# Altium footprint library esp32.PCBLIB: 2 footprints
Each footprint in its own frame and in the unit in brackets; x right, y up, seen from the top. Pads: shape width x height; smd on the part's side, far side on the other; paste and mask are expansions set on the pad; w line width, h text height; cw(c..) or ccw(c..) is an arc to the next point about the centre after c.
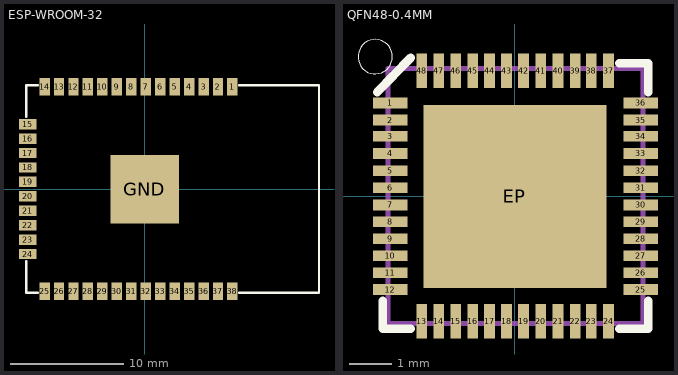
[diagram p0: the footprints below, top view; thin cyan lines are the x and y axes]

## ESP-WROOM-32 [mil]
pads (39):
  rect 36x60 smd: 1(304,355) 2(254,355) 3(204,355) 4(154,355) 5(104,355) 6(54,355) 7(4,355) 8(-46.85,355) 9(-96.85,355) 10(-146.85,355) 11(-196.85,355) 12(-246.85,355) 13(-296.85,355) 14(-346.85,355) 25(-346.85,-354.33) 26(-296.85,-354.33) 27(-246.85,-354.33) 28(-196.85,-354.33) 29(-146.85,-354.33) 30(-96.85,-354.33) 31(-46.85,-354.33) 32(4,-354.33) 33(54,-354.33) 34(104,-354.33) 35(154,-354.33) 36(204,-354.33) 37(254,-354.33) 38(304,-354.33)
  rect 60x36 smd: 15(-405.51,225) 16(-405.51,175) 17(-405.51,125) 18(-405.51,75) 19(-405.51,25) 20(-405.51,-25) 21(-405.51,-75) 22(-405.51,-125) 23(-405.51,-175) 24(-405.51,-225)
  rect 237x237 smd: GND(0,0)
Top Overlay:
  lines w8: -410.51,-250 -410.51,-359.33 -370.08,-359.33 ; -410.51,250 -410.51,360 -370.08,360 ; 328,-359.33 604,-359.33 604,360 328,360
Mechanical 8:
  region: 0,0 10,0 10,10 0,10
Mechanical 9:
  region: 0,0 10,0 10,10 0,10
Mechanical 10:
  region: 0,0 10,0 10,10 0,10
Mechanical 27:
  region: 0,0 10,0 10,10 0,10
Mechanical 28:
  region: 0,0 10,0 10,10 0,10
3D body: height 114.37, standoff -0.28, extent -405,-354.33 598.94,354.33

## QFN48-0.4MM [mil]
pads (49):
  rect 32x10 smd: 1(-116.14,87) 2(-116.14,71) 3(-116.14,56) 4(-116.14,40) 5(-116.14,24) 6(-116.14,8) 7(-116.14,-7.87) 8(-116.14,-23.62) 9(-116.14,-39.37) 10(-116.14,-55.12) 11(-116.14,-70.87) 12(-116.14,-86.61) 25(117,-86.61) 26(117,-70.87) 27(117,-55.12) 28(117,-39.37) 29(117,-23.62) 30(117,-7.87) 31(117,8) 32(117,24) 33(117,40) 34(117,56) 35(117,71) 36(117,87)
  rect 10x32 smd: 13(-86.61,-116.14) 14(-70.87,-116.14) 15(-55.12,-116.14) 16(-39.37,-116.14) 17(-23.62,-116.14) 18(-7.87,-116.14) 19(8,-116.14) 20(24,-116.14) 21(40,-116.14) 22(56,-116.14) 23(71,-116.14) 24(87,-116.14) 37(87,117) 38(71,117) 39(56,117) 40(40,117) 41(24,117) 42(8,117) 43(-7.87,117) 44(-23.62,117) 45(-39.37,117) 46(-55.12,117) 47(-70.87,117) 48(-86.61,117)
  rect 170x170 smd: EP(0,0)
Top Overlay:
  circle w0: c-130,130 r16
  lines w8: -128.11,97 -96.89,129 ; -123.11,-96.89 -123.11,-123.11 -96.89,-123.11 ; 97,-123.11 124,-123.11 124,-96.89 ; 97,124 124,124 124,97
Top Paste:
  rectangle: 13,13 73,73
  region: -12.32,13.07 -12.32,72.93 -72.32,72.93 -72.32,13.07
  region: -12.4,-12.4 -72.25,-12.4 -72.25,-72.25 -12.4,-72.25
  region: 13.07,-12.32 13.07,-72.32 72.93,-72.32 72.93,-12.32
Mechanical 16:
  drawing of 53 lines, arcs and shapes, not listed